# Altium footprint library PCB贴片元件封装库.pcblib: 366 footprints (part 23 of 23)
Each footprint in its own frame and in the unit in brackets; x right, y up, seen from the top. Pads: shape width x height; smd on the part's side, far side on the other; paste and mask are expansions set on the pad; w line width, h text height; cw(c..) or ccw(c..) is an arc to the next point about the centre after c.
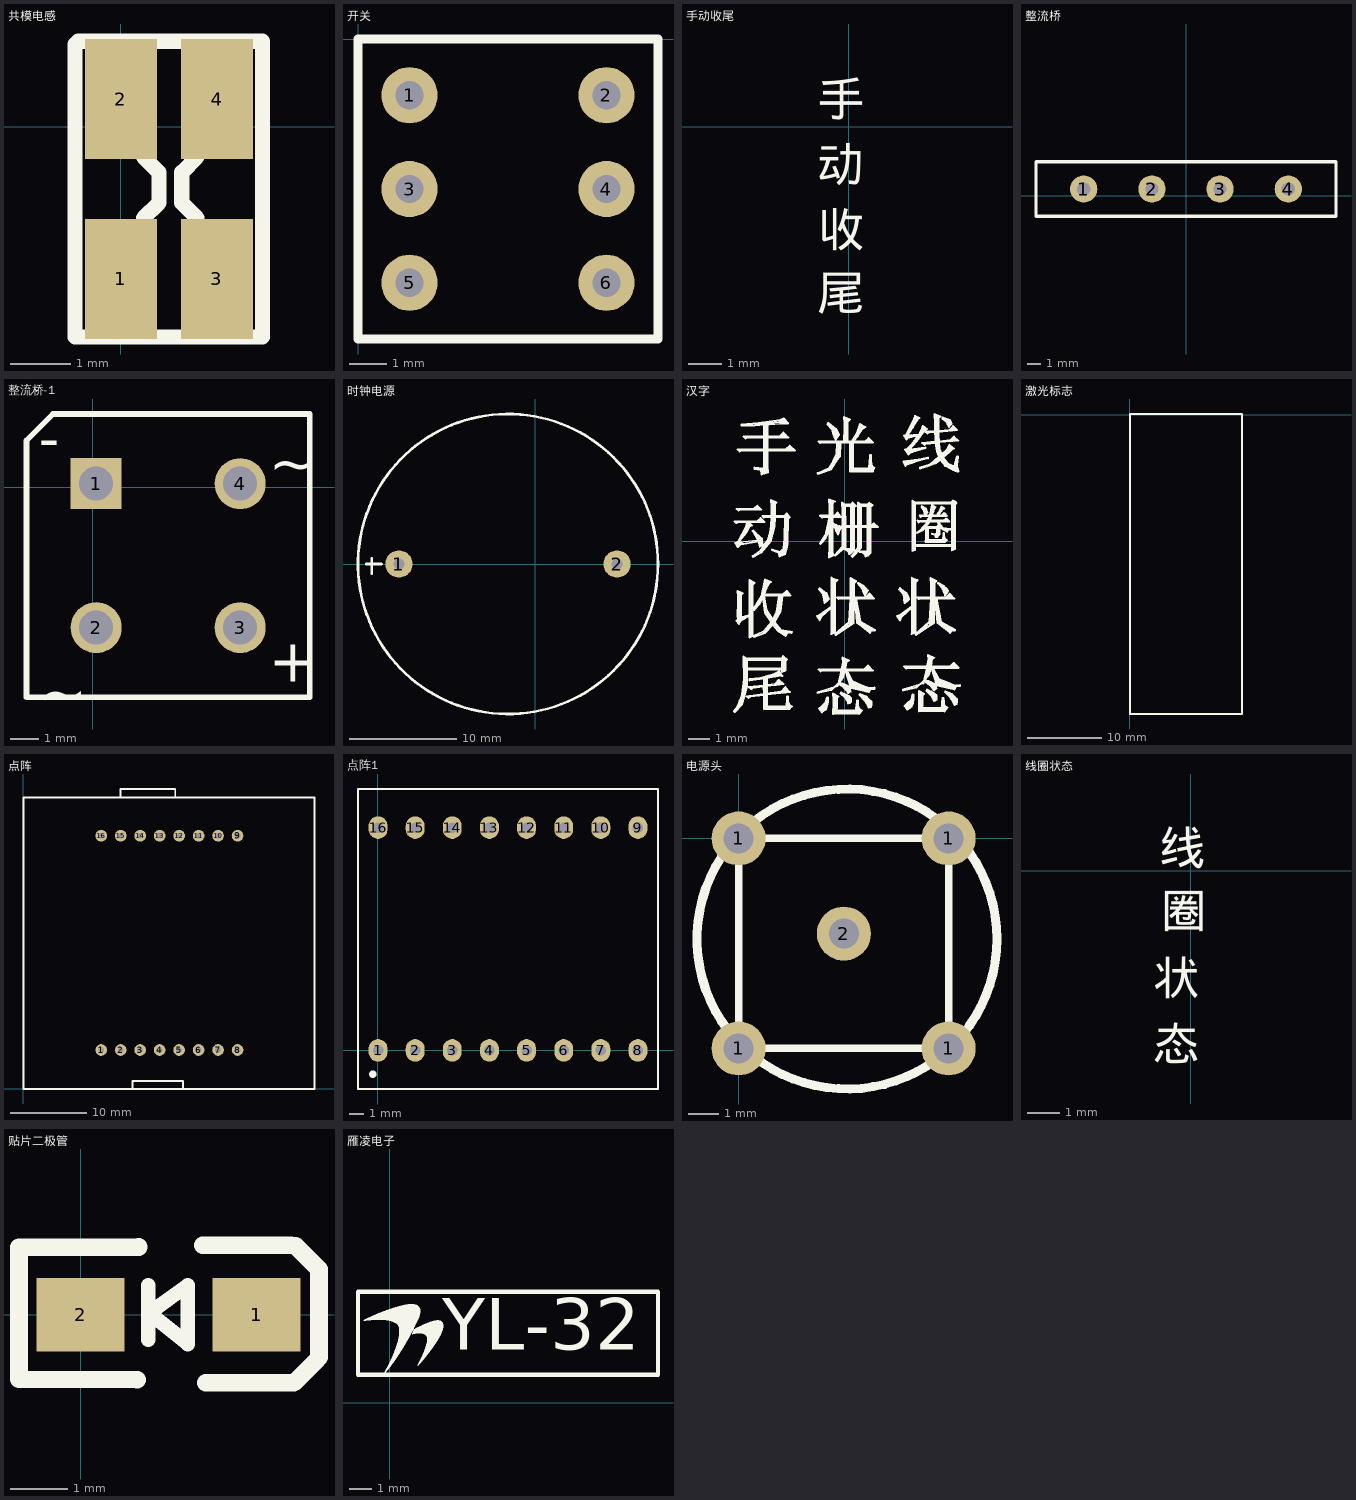
[diagram p22: the footprints below, top view; thin cyan lines are the x and y axes]

## 共模电感 [mm]
pads (4):
  rect 1.2x2 smd: 1(0,-2.54) 2(0,0.46) 3(1.6,-2.54) 4(1.605,0.46)
TopOverlay:
  lines w0.254: 0.381,-1.524 0.635,-1.27 0.635,-0.835 0.635,-0.762 0.381,-0.508 ; 1.27,-1.524 1.016,-1.27 1.016,-0.835 1.016,-0.762 1.27,-0.508 ; -0.762,-3.505 2.362,-3.505 2.362,1.422 -0.711,1.422 -0.762,1.372 -0.762,-3.505

## 开关 [mil]
pads (6):
  round 60 hole 30: 1(55,-60) 2(265,-60) 3(55,-160) 4(265,-160) 5(55,-260) 6(265,-260)
TopOverlay:
  lines w10: 0,-320 0,0 320,0 320,-320 0,-320

## 手动收尾 [mil]
TopOverlay:
  text "手" at -36.93,-0.82 h70
  text "动" at -37,-78.15 h70
  text "收" at -36.93,-155.64 h70
  text "尾" at -37,-231 h70

## 整流桥 [mil]
pads (4):
  round 80 hole 39: 1(-300,20) 2(-100,20) 3(100,20) 4(300,20)
TopOverlay:
  lines w10: -440,-60 440,-60 440,100 -440,100 -440,-60

## 整流桥-1 [mm]
pads (4):
  rect 1.8x1.8 hole 1.2: 1(0.127,0.127)
  round 1.8 hole 1.2: 2(0.127,-4.953) 3(5.207,-4.953) 4(5.207,0.127)
TopOverlay:
  lines w0.2: -2.333,-7.413 -2.333,1.651 -1.397,2.587 7.667,2.587 7.667,-7.413 -2.333,-7.413
  text "+" at 6.223,-6.858 h1.5
  text "-" at -1.905,1.016 h1.5
  text "~" at -1.905,-8.001 h1.5
  text "~" at 6.223,0.127 h1.5

## 时钟电源 [mm]
pads (2):
  round 2.54 hole 1: 1(-12.7,0) 2(7.62,0)
TopOverlay:
  circle w0.254: c-2.54,0 r13.97
  lines w0.254: -15.748,0 -14.328,0 ; -15.24,-0.914 -15.24,0.508

## 汉字 [mil]
TopOverlay:
  drawing of 2036 lines, arcs and shapes, not listed

## 激光标志 [mil]
TopOverlay:
  lines w10: 0,-1574.8 0,5 590.55,5 590.55,-1574.45 0.35,-1574.45

## 点阵 [mil]
pads (16):
  round 60 hole 30: 1(400,200) 2(500,200) 3(600,200) 4(700,200) 5(800,200) 6(900,200) 7(1000,200) 8(1100,200) 9(1100,1300) 10(1000,1300) 11(900,1300) 12(800,1300) 13(700,1300) 14(600,1300) 15(500,1300) 16(400,1300)
TopOverlay:
  lines w10: 500,1500 500,1540 640,1540 780,1540 780,1496.06 ; 560,0 560,40 820,40 820,0 ; 0,0 0,1496.06 1496.06,1496.06 1496.06,0 0,0

## 点阵1 [mil]
pads (16):
  oval 50x60 hole 28: 1(1.3,0) 2(99.72,0) 3(198.15,0) 4(296.57,0) 5(395,0) 6(493.43,0) 7(591.85,0) 8(690.28,0) 9(690.28,590.55) 10(591.85,590.55) 11(493.43,590.55) 12(395,590.55) 13(296.57,590.55) 14(198.15,590.55) 15(99.72,590.55) 16(1.3,590.55)
TopOverlay:
  circle w9.84: c-12.48,-62.99 r4.92
  lines w6: -51.85,-102.36 743.43,-102.36 743.43,692.91 -51.85,692.91 -51.85,-102.36

## 电源头 [mm]
pads (5):
  round 1.8 hole 1: 1(0,-7) 1(0,0) 1(7,-7) 1(7,0) 2(3.505,-3.175)
TopOverlay:
  circle w0.3: c3.611,-3.353 r5
  lines w0.254: 0,-7 0,0 7,0 7,-7 0,-7

## 线圈状态 [mil]
TopOverlay:
  text "线" at -38,-6 h70
  text "圈" at -36,-82 h70
  text "状" at -44.93,-162.61 h70
  text "态" at -44.93,-242.21 h70

## 贴片二极管 [mil]
pads (2):
  rect 60x50 smd: 1(120,0) 2(0,0)
TopOverlay:
  lines w10: 46,-17 46,20 ; 47,1 73,20 73,-20 47,1
  lines w12: 38.52,-44.45 -42,-44 -42,46 39.62,46.1 ; 83.23,47.19 143.23,47.19 ; 85.37,-46.37 145.37,-46.37 ; 145.91,-46.1 160.91,-31.1 ; 146.49,46.92 161.49,31.92 ; 162.49,-29 162.49,31

## 雁凌电子 [mil]
TopOverlay:
  drawing of 1045 lines, arcs and shapes, not listed
  text "YL-32" at 94,64 h157.48